# Altium footprint library UWRT Footprint Library.PcbLib: 258 footprints (part 6 of 17)
Each footprint in its own frame and in the unit in brackets; x right, y up, seen from the top. Pads: shape width x height; smd on the part's side, far side on the other; paste and mask are expansions set on the pad; w line width, h text height; cw(c..) or ccw(c..) is an arc to the next point about the centre after c.
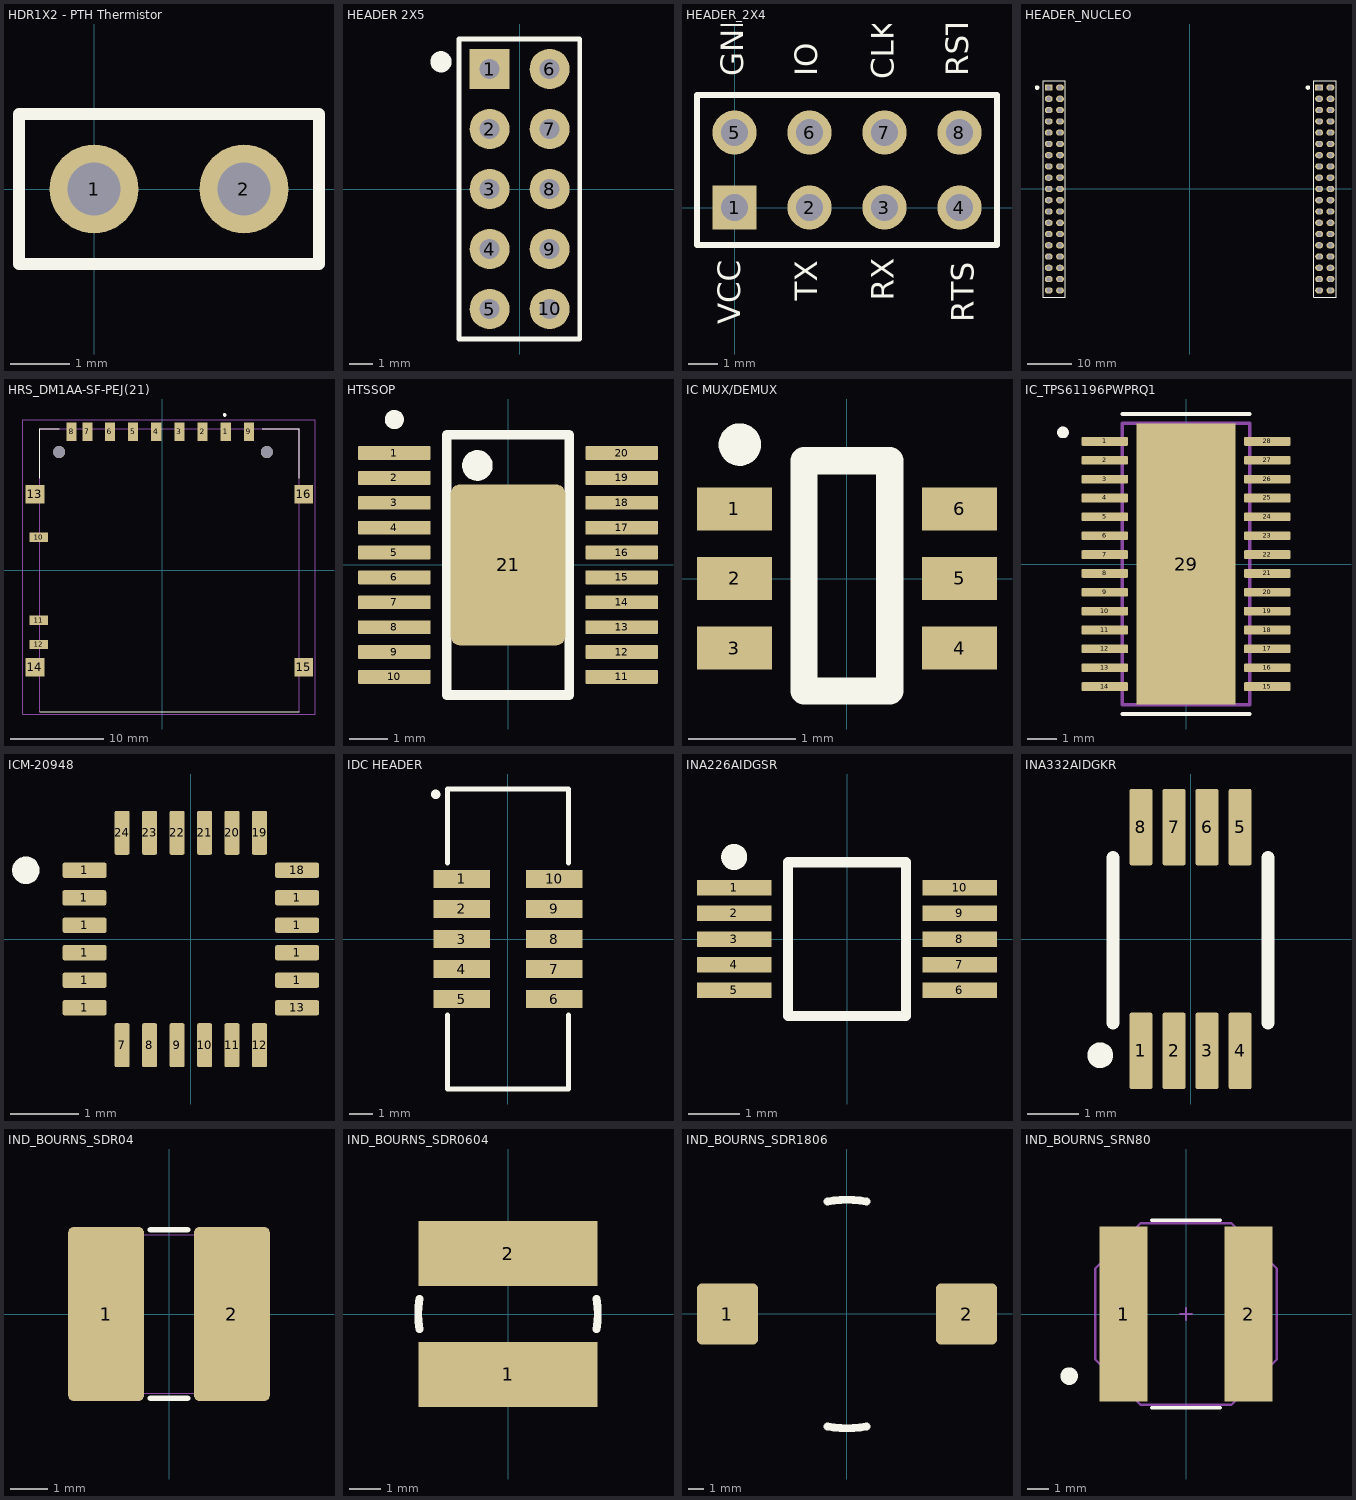
[diagram p5: the footprints below, top view; thin cyan lines are the x and y axes]

## HDR1X2 - PTH Thermistor [mm] "Connector; Header; 2 Position"
pads (2):
  round 1.5 hole 0.9: 1(0,0) 2(2.54,0)
Top Overlay:
  lines w0.2: -1.27,-1.27 -1.27,1.27 3.81,1.27 3.81,-1.27 -1.27,-1.27

## HEADER 2X5 [mm] "CONN HEADER VERT 10POS 2.54MM"
pads (10):
  rect 1.7x1.7 hole 0.85: 1(-1.27,5.08)
  round 1.7 hole 0.85: 2(-1.27,2.54) 3(-1.27,0) 4(-1.27,-2.54) 5(-1.27,-5.08) 6(1.27,5.08) 7(1.27,2.54) 8(1.27,0) 9(1.27,-2.54) 10(1.27,-5.08)
Top Overlay:
  circle w0.5: c-3.327,5.385 r0.2
  lines w0.2: 2.515,-6.35 -2.565,-6.35 -2.565,6.35 2.515,6.35 ; 2.54,-6.35 2.54,6.35
3D body "901512210.stp": height 8.51, standoff -2.89, extent -2.54,-6.35 2.54,6.35

## HEADER_2X4 [mm]
pads (8):
  rect 1.5x1.5 hole 0.9: 1(0,0)
  round 1.5 hole 0.9: 2(2.54,0) 3(5.08,0) 4(7.62,0) 5(0,2.54) 6(2.54,2.54) 7(5.08,2.54) 8(7.62,2.54)
Top Overlay:
  lines w0.2: -1.27,-1.27 8.89,-1.27 8.89,3.81 -1.27,3.81 -1.27,-1.27
  text "GND" at 0.3,4.446 h0.76
  text "VCC" at 0.2,-3.954 h0.76
  text "RST" at 7.92,4.446 h0.76
  text "CLK" at 5.4,4.346 h0.76
  text "IO" at 2.8,4.446 h0.76
  text "RTS" at 8.1,-3.879 h0.76
  text "RX" at 5.4,-3.152 h0.76
  text "TX" at 2.8,-3.152 h0.76
3D body "User Library-2_54mm Male Header (4x2).STEP": height 8.54, standoff -3, extent -1.36,-1.315 8.8,3.665

## HEADER_NUCLEO [mil] "Nucleo board's header"
pads (76):
  rect 70x55 hole 40: 1(-1250,900) 39(1150,900)
  oval 70x55 hole 40: 2(-1150,900) 3(-1250,800) 4(-1150,800) 5(-1250,700) 6(-1150,700) 7(-1250,600) 8(-1150,600) 9(-1250,500) 10(-1150,500) 11(-1250,400) 12(-1150,400) 13(-1250,300) 14(-1150,300) 15(-1250,200) 16(-1150,200) 17(-1250,100) 18(-1150,100) 19(-1250,0) 20(-1150,0) 21(-1250,-100) 22(-1150,-100) 23(-1250,-200) 24(-1150,-200) 25(-1250,-300) 26(-1150,-300) 27(-1250,-400) 28(-1150,-400) 29(-1250,-500) 30(-1150,-500) 31(-1250,-600) 32(-1150,-600) 33(-1250,-700) 34(-1150,-700) 35(-1250,-800) 36(-1150,-800) 37(-1250,-900) 38(-1150,-900) 40(1250,900) 41(1150,800) 42(1250,800) 43(1150,700) 44(1250,700) 45(1150,600) 46(1250,600) 47(1150,500) 48(1250,500) 49(1150,400) 50(1250,400) 51(1150,300) 52(1250,300) 53(1150,200) 54(1250,200) 55(1150,100) 56(1250,100) 57(1150,0) 58(1250,0) 59(1150,-100) 60(1250,-100) 61(1150,-200) 62(1250,-200) 63(1150,-300) 64(1250,-300) 65(1150,-400) 66(1250,-400) 67(1150,-500) 68(1250,-500) 69(1150,-600) 70(1250,-600) 71(1150,-700) 72(1250,-700) 73(1150,-800) 74(1250,-800) 75(1150,-900) 76(1250,-900)
Top Overlay:
  circle w20: c-1352.92,899.65 r10
  circle w20: c1049.45,899.96 r10
  lines w10: -1302.25,-960.35 -1302.25,-959.69 -1302.25,959.65 -1102.92,959.65 -1102.92,-960.35 -1302.25,-960.35 ; 1100.12,-960.04 1100.12,959.55 1100.21,959.65 1299.45,959.65 1299.45,-960.04 1100.12,-960.04
3D body "_ _ _C192LFBN-RC.STEP": height 335.15, standoff -125.48, extent -1302.92,-960.35 -1102.92,959.33
3D body "_ _ _C192LFBN-RC.STEP": height 335.15, standoff -125.48, extent 1100.21,-960.04 1300.21,959.65

## HRS_DM1AA-SF-PEJ(21) [mm]
pads (18):
  rect 1.1x2 smd: 1(6.875,14.95) 2(4.375,14.95) 3(1.875,14.95) 4(-0.625,14.95) 5(-3.125,14.95) 6(-5.625,14.95) 7(-8.05,14.95) 8(-9.75,14.95) 9(9.375,14.95)
  rect 2x1 smd: 10(-13.3,3.55) 11(-13.3,-5.4) 12(-13.3,-8)
  rect 2x2 smd: 13(-13.7,8.2) 14(-13.7,-10.45) 15(15.3,-10.45) 16(15.3,8.2)
  round 1.3 hole 1.3 unplated: ""(-11.1,12.75) ""(11.3,12.75)
Top Overlay:
  circle w0.2: c6.75,16.75 r0.1
  lines w0.127: -13.2,-15.25 14.8,-15.25 ; -13.2,9.906 -13.2,15.25 -11.1,15.25 ; 10.795,15.25 14.8,15.25 14.8,9.906
Mechanical 13:
  lines w0.127: -13.2,-15.25 -13.2,15.25 14.8,15.25 14.8,-15.25
Mechanical 15:
  lines w0.05: -15,-15.5 -13,-15.5 13.25,-15.5 16.5,-15.5 16.5,16.25 -15,16.25 -15,-15.5
3D body "User Library-DM1AA-SF-PEJ.step": height 2.9, standoff -0.55, extent -14.2,-15.25 15.8,15.25

## HTSSOP [mm]
pads (21):
  rrect15% 1.9x0.36 smd: 1(-2.97,2.925) 2(-2.97,2.275) 3(-2.97,1.625) 4(-2.97,0.975) 5(-2.97,0.325) 6(-2.97,-0.325) 7(-2.97,-0.975) 8(-2.97,-1.625) 9(-2.97,-2.275) 10(-2.97,-2.925) 11(2.97,-2.925) 12(2.97,-2.275) 13(2.97,-1.625) 14(2.97,-0.975) 15(2.97,-0.325) 16(2.97,0.325) 17(2.97,0.975) 18(2.97,1.625) 19(2.97,2.275) 20(2.97,2.925)
  rrect15% 3x4.2 smd: 21(0,0)
Top Overlay:
  circle w0.25: c-2.97,3.8 r0.125
  circle w0.4: c-0.8,2.6 r0.2
  lines w0.254: -1.6,-3.4 1.6,-3.4 1.6,3.4 -1.6,3.4 -1.6,-3.4
3D body "NOPB.STEP": height 1.1, standoff 0, extent -3.2,-3.25 3.2,3.25

## IC MUX/DEMUX [mm]
pads (6):
  rect 0.7x0.4 smd: 1(-1.05,0.65) 2(-1.05,0) 3(-1.05,-0.65) 4(1.05,-0.65) 5(1.05,0) 6(1.05,0.65)
Top Overlay:
  circle w0.254: c-1,1.25 r0.071
  lines w0.254: -0.4,-1.05 -0.4,1.1 0.4,1.1 0.4,-1.05 -0.4,-1.05
3D body "74LVC1G3157GW,125.stp": height 1.11, standoff 0.01, extent -1.05,-1 1.05,1

## IC_TPS61196PWPRQ1 [mm]
pads (29):
  rrect25% 1.6x0.3 smd paste-2 mask+0: 1(-2.8,4.225) 2(-2.8,3.575) 3(-2.8,2.925) 4(-2.8,2.275) 5(-2.8,1.625) 6(-2.8,0.975) 7(-2.8,0.325) 8(-2.8,-0.325) 9(-2.8,-0.975) 10(-2.8,-1.625) 11(-2.8,-2.275) 12(-2.8,-2.925) 13(-2.8,-3.575) 14(-2.8,-4.225) 15(2.8,-4.225) 16(2.8,-3.575) 17(2.8,-2.925) 18(2.8,-2.275) 19(2.8,-1.625) 20(2.8,-0.975) 21(2.8,-0.325) 22(2.8,0.325) 23(2.8,0.975) 24(2.8,1.625) 25(2.8,2.275) 26(2.8,2.925) 27(2.8,3.575) 28(2.8,4.225)
  rect 3.4x9.7 smd paste-6 mask+0: 29(0,0)
Top Overlay:
  circle w0.2: c-4.24,4.535 r0.1
  lines w0.127: -2.2,-5.17 2.2,-5.17 ; -2.2,5.17 2.2,5.17
Top Paste:
  region: 3.575,-4.35 2.025,-4.35 2.025,-4.1 3.575,-4.1
  region: 3.575,-3.7 2.025,-3.7 2.025,-3.45 3.575,-3.45
  region: 3.575,-3.05 2.025,-3.05 2.025,-2.8 3.575,-2.8
  region: 3.575,-2.4 2.025,-2.4 2.025,-2.15 3.575,-2.15
  region: 3.575,-1.75 2.025,-1.75 2.025,-1.5 3.575,-1.5
  region: 3.575,-1.1 2.025,-1.1 2.025,-0.85 3.575,-0.85
  region: 3.575,-0.45 2.025,-0.45 2.025,-0.2 3.575,-0.2
  region: -2.025,-4.35 -3.575,-4.35 -3.575,-4.1 -2.025,-4.1
  region: -2.025,-3.7 -3.575,-3.7 -3.575,-3.45 -2.025,-3.45
  region: -2.025,-3.05 -3.575,-3.05 -3.575,-2.8 -2.025,-2.8
  region: -2.025,-2.4 -3.575,-2.4 -3.575,-2.15 -2.025,-2.15
  region: -2.025,-1.75 -3.575,-1.75 -3.575,-1.5 -2.025,-1.5
  region: -2.025,-1.1 -3.575,-1.1 -3.575,-0.85 -2.025,-0.85
  region: -2.025,-0.45 -3.575,-0.45 -3.575,-0.2 -2.025,-0.2
  region: 3.575,0.2 2.025,0.2 2.025,0.45 3.575,0.45
  region: -2.025,0.2 -3.575,0.2 -3.575,0.45 -2.025,0.45
  region: 3.575,0.85 2.025,0.85 2.025,1.1 3.575,1.1
  region: -2.025,0.85 -3.575,0.85 -3.575,1.1 -2.025,1.1
  region: 3.575,1.5 2.025,1.5 2.025,1.75 3.575,1.75
  region: -2.025,1.5 -3.575,1.5 -3.575,1.75 -2.025,1.75
  region: 3.575,2.15 2.025,2.15 2.025,2.4 3.575,2.4
  region: -2.025,2.15 -3.575,2.15 -3.575,2.4 -2.025,2.4
  region: 3.575,2.8 2.025,2.8 2.025,3.05 3.575,3.05
  region: -2.025,2.8 -3.575,2.8 -3.575,3.05 -2.025,3.05
  region: 3.575,3.45 2.025,3.45 2.025,3.7 3.575,3.7
  region: -2.025,3.45 -3.575,3.45 -3.575,3.7 -2.025,3.7
  region: 3.575,4.1 2.025,4.1 2.025,4.35 3.575,4.35
  region: -2.025,4.1 -3.575,4.1 -3.575,4.35 -2.025,4.35
  region: 1.2,-3.23 -1.2,-3.23 -1.2,3.23 1.2,3.23
Top Solder:
  region: 3.67,-4.445 1.93,-4.445 1.93,-4.005 3.67,-4.005
  region: 3.67,-3.795 1.93,-3.795 1.93,-3.355 3.67,-3.355
  region: 3.67,-3.145 1.93,-3.145 1.93,-2.705 3.67,-2.705
  region: 3.67,-2.495 1.93,-2.495 1.93,-2.055 3.67,-2.055
  region: 3.67,-1.845 1.93,-1.845 1.93,-1.405 3.67,-1.405
  region: 3.67,-1.195 1.93,-1.195 1.93,-0.755 3.67,-0.755
  region: 3.67,-0.545 1.93,-0.545 1.93,-0.105 3.67,-0.105
  region: -1.93,-4.445 -3.67,-4.445 -3.67,-4.005 -1.93,-4.005
  region: -1.93,-3.795 -3.67,-3.795 -3.67,-3.355 -1.93,-3.355
  region: -1.93,-3.145 -3.67,-3.145 -3.67,-2.705 -1.93,-2.705
  region: -1.93,-2.495 -3.67,-2.495 -3.67,-2.055 -1.93,-2.055
  region: -1.93,-1.845 -3.67,-1.845 -3.67,-1.405 -1.93,-1.405
  region: -1.93,-1.195 -3.67,-1.195 -3.67,-0.755 -1.93,-0.755
  region: -1.93,-0.545 -3.67,-0.545 -3.67,-0.105 -1.93,-0.105
  region: 3.67,0.105 1.93,0.105 1.93,0.545 3.67,0.545
  region: -1.93,0.105 -3.67,0.105 -3.67,0.545 -1.93,0.545
  region: 3.67,0.755 1.93,0.755 1.93,1.195 3.67,1.195
  region: -1.93,0.755 -3.67,0.755 -3.67,1.195 -1.93,1.195
  region: 3.67,1.405 1.93,1.405 1.93,1.845 3.67,1.845
  region: -1.93,1.405 -3.67,1.405 -3.67,1.845 -1.93,1.845
  region: 3.67,2.055 1.93,2.055 1.93,2.495 3.67,2.495
  region: -1.93,2.055 -3.67,2.055 -3.67,2.495 -1.93,2.495
  region: 3.67,2.705 1.93,2.705 1.93,3.145 3.67,3.145
  region: -1.93,2.705 -3.67,2.705 -3.67,3.145 -1.93,3.145
  region: 3.67,3.355 1.93,3.355 1.93,3.795 3.67,3.795
  region: -1.93,3.355 -3.67,3.355 -3.67,3.795 -1.93,3.795
  region: 3.67,4.005 1.93,4.005 1.93,4.445 3.67,4.445
  region: -1.93,4.005 -3.67,4.005 -3.67,4.445 -1.93,4.445
  region: 1.2,-3.23 -1.2,-3.23 -1.2,3.23 1.2,3.23
Mechanical 13:
  circle w0.2: c-4.24,4.535 r0.1
  lines w0.127: -2.2,-4.85 -2.2,4.85 2.2,4.85 2.2,-4.85 -2.2,-4.85
3D body "LM5175PWPR.STEP": height 1.2, standoff 0, extent -3.197,-4.85 3.203,4.85

## ICM-20948 [mm] "24-QFN"
height 1.05
pads (24):
  rrect25% 0.64x0.22 smd: 1(-1.55,0.6) 1(-1.545,-1) 1(-1.545,-0.6) 1(-1.545,-0.2) 1(-1.545,0.2) 1(-1.545,1) 1(1.545,-0.6) 1(1.545,-0.2) 1(1.545,0.2) 1(1.545,0.6) 13(1.545,-1) 18(1.545,1)
  rrect25% 0.22x0.64 smd: 7(-1,-1.545) 8(-0.6,-1.545) 9(-0.2,-1.545) 10(0.2,-1.545) 11(0.6,-1.545) 12(1,-1.545) 19(1,1.545) 20(0.6,1.545) 21(0.2,1.545) 22(-0.2,1.545) 23(-0.6,1.545) 24(-1,1.545)
Top Overlay:
  circle w0.2: c-2.4,1 r0.1
3D body "ICM-20948--3DModel-STEP-56544.STEP": height 1.06, standoff 0.01, extent -1.5,-1.5 1.5,1.5

## IDC HEADER [mm]
pads (10):
  rect 2.4x0.76 smd: 1(-1.95,2.54) 2(-1.95,1.27) 3(-1.95,0) 4(-1.95,-1.27) 5(-1.95,-2.54) 6(1.95,-2.54) 7(1.95,-1.27) 8(1.95,0) 9(1.95,1.27) 10(1.95,2.54)
Top Overlay:
  circle w0.254: c-3.05,6.1 r0.071
  lines w0.2: -2.55,-3.2 -2.55,-6.325 2.55,-6.325 2.55,-3.2 ; -2.55,3.2 -2.55,6.325 2.55,6.325 2.55,3.2

## INA226AIDGSR [mm]
pads (10):
  rect 1.45x0.3 smd: 1(-2.2,1) 2(-2.2,0.5) 3(-2.2,0) 4(-2.2,-0.5) 5(-2.2,-1) 6(2.2,-1) 7(2.2,-0.5) 8(2.2,0) 9(2.2,0.5) 10(2.2,1)
Top Overlay:
  circle w0.254: c-2.2,1.6 r0.127
  lines w0.2: -1.15,-1.5 1.15,-1.5 1.15,1.5 -1.15,1.5 -1.15,-1.5
3D body "ADS1115IDGSR--3DModel-STEP-56544.STEP": height 1.06, standoff -0.04, extent -2.45,-1.5 2.45,1.5

## INA332AIDGKR [mm] "Instrumentation amplifier, 8-VSSOP"
pads (8):
  rrect15% 0.45x1.5 smd mask+0.05: 1(-0.975,-2.2) 2(-0.325,-2.2) 3(0.325,-2.2) 4(0.975,-2.2) 5(0.975,2.2) 6(0.325,2.2) 7(-0.325,2.2) 8(-0.975,2.2)
Top Overlay:
  circle w0.254: c-1.778,-2.286 r0.127
  lines w0.254: -1.524,-1.651 -1.524,1.6 ; 1.524,-1.651 1.524,1.6
3D body "User Library-SOP50P310X110-8N[VSSOP_DGK_MO-187AA].STEP": height 1.15, standoff 0, extent -1.55,-2.522 1.55,2.522

## IND_BOURNS_SDR04 [mm] "SDR0403 Series - SMD Power Inductors"
height 3.5
pads (2):
  rrect15% 2.05x4.7 smd paste+0 mask+0.102: 1(-1.7,0) 2(1.7,0)
Top Overlay:
  lines w0.152: -0.5,-2.273 0.5,-2.273 ; -0.5,2.273 0.5,2.273
Mechanical 13:
  lines w0.025: -2.4,-1.073 -1.2,-2.146 1.2,-2.146 2.4,-1.073 2.4,1.073 1.2,2.146 -1.2,2.146 -2.4,1.073 -2.4,-1.073
  text "*" at -2.21,-1.27 h1.27
3D body "sdr0403.stp": height 3.2, standoff 0, extent -2.25,-2.25 2.25,2.25

## IND_BOURNS_SDR0604 [mm]
pads (2):
  rect 5.8x2.1 smd: 1(0,-1.95) 2(0,1.95)
Top Overlay:
  lines w0.254: -2.858,-0.493 cw(c0,0) -2.858,0.493 ; 2.858,-0.493 ccw(c0,0) 2.858,0.493
3D body "69538.stp": height 4.8, standoff 0, extent -2.9,-2.9 2.9,2.9

## IND_BOURNS_SDR1806 [mm]
pads (2):
  rrect15% 4x4 smd mask+0.2: 1(-7.85,0) 2(7.85,0)
Top Overlay:
  lines w0.508: -1.274,-7.391 ccw(c0,0) 1.274,-7.391 ; -1.274,7.391 cw(c0,0) 1.274,7.391
3D body "sdr1806.stp": height 6.6, standoff 0, extent -9.15,-7 9.15,7

## IND_BOURNS_SRN80 [mil]
pads (2):
  rect 87x315 smd paste+0 mask+0: 1(-112.5,0) 2(112.5,0)
Top Overlay:
  circle w15.75: c-210.3,-111.8 r7.87
  lines w6: -61.89,-168.5 61.89,-168.5 ; -61.89,168.5 61.89,168.5
Mechanical 13:
  lines w3.94: -163.5,-81.75 -81.75,-163.5 81.75,-163.5 163.5,-81.75 163.5,81.75 81.75,163.5 -81.75,163.5 -163.5,81.75 -163.5,-81.75
Mechanical 15:
  lines w3.94: -10.24,0 10.24,0 ; 0,-10.24 0,10.24
3D body: height 10, standoff 0, extent 0,0 10,10
3D body "srn8040.stp": height 156.01, standoff 0.5, extent -160.43,-155.51 160.44,155.51